# Altium footprint library PowerSupply.PcbLib: 67 footprints (part 1 of 5)
Each footprint in its own frame and in the unit in brackets; x right, y up, seen from the top. Pads: shape width x height; smd on the part's side, far side on the other; paste and mask are expansions set on the pad; w line width, h text height; cw(c..) or ccw(c..) is an arc to the next point about the centre after c.
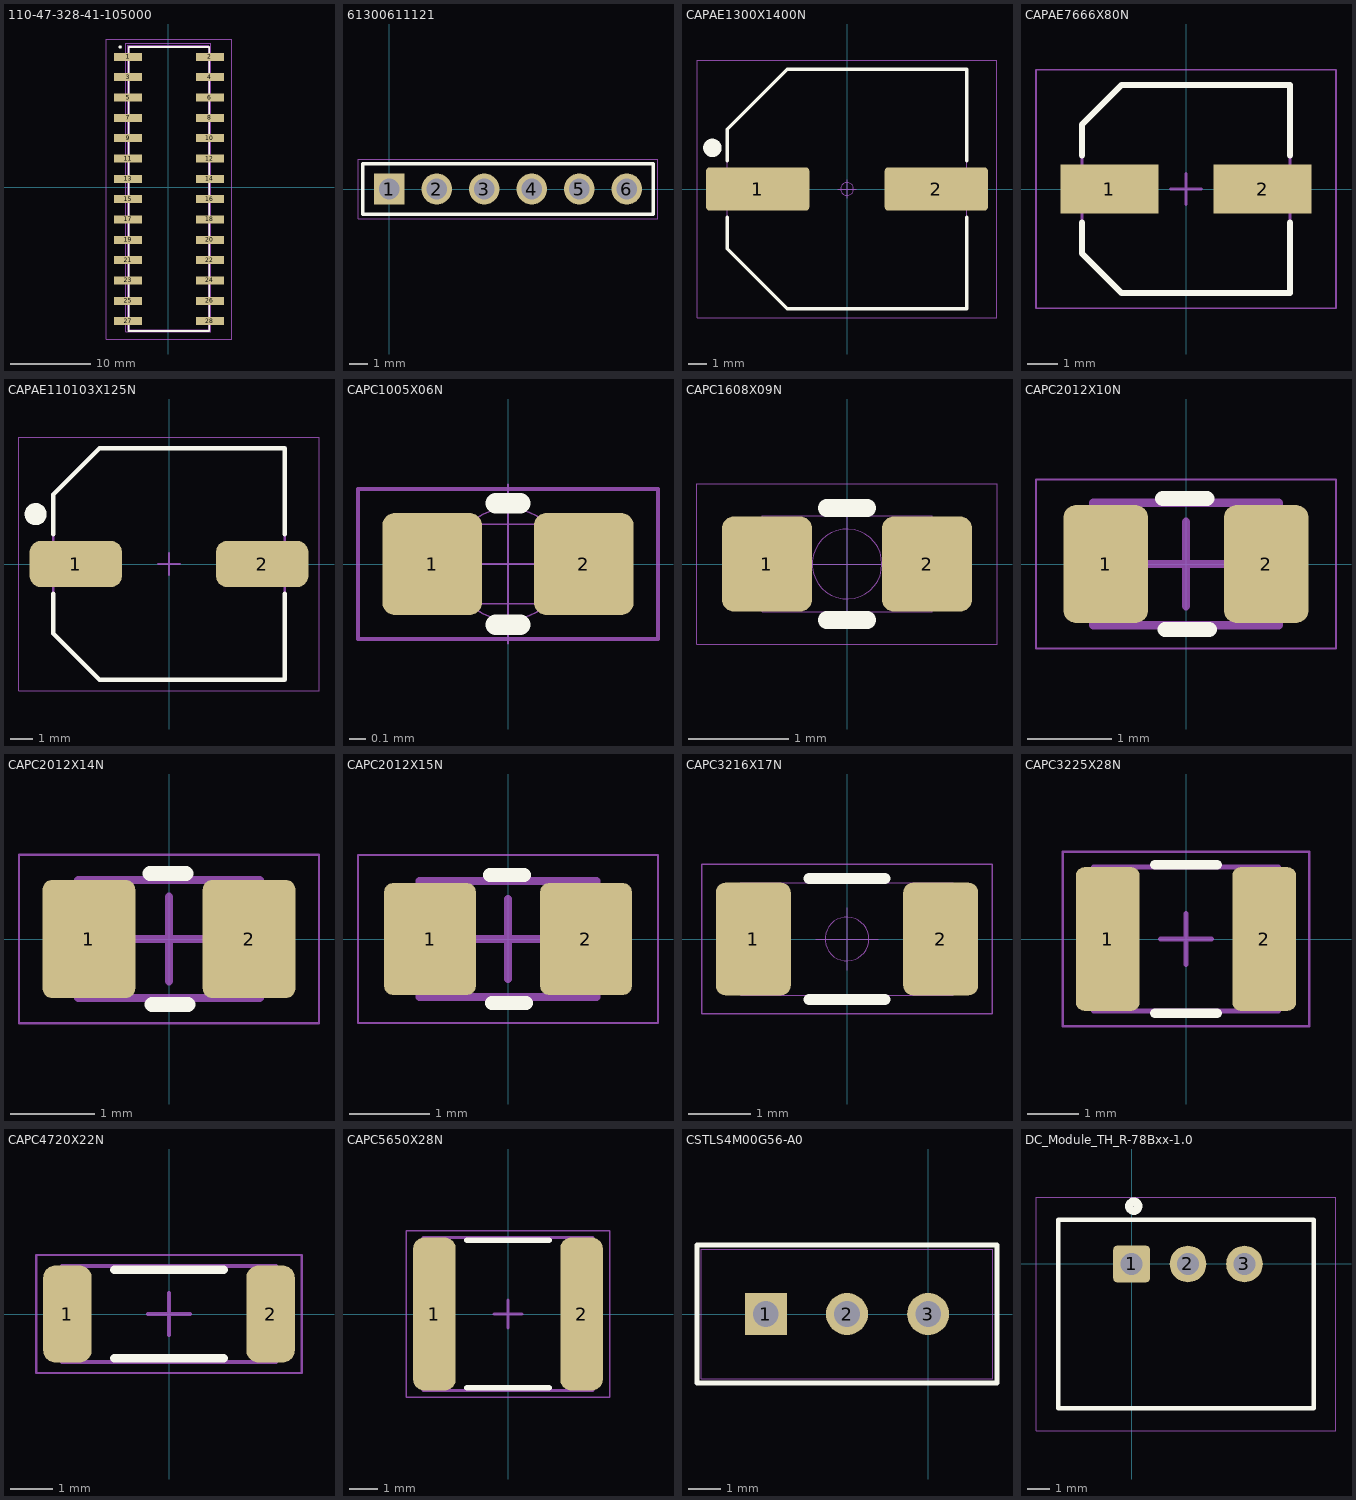
[diagram p0: the footprints below, top view; thin cyan lines are the x and y axes]

## 110-47-328-41-105000 [mm]
pads (28):
  rect 3.51x1 smd: 1(-5.005,16.31) 2(5.205,16.31) 3(-5.005,13.77) 4(5.205,13.77) 5(-5.005,11.23) 6(5.205,11.23) 7(-5.005,8.69) 8(5.205,8.69) 9(-5.005,6.15) 10(5.205,6.15) 11(-5.005,3.61) 12(5.205,3.61) 13(-5.005,1.07) 14(5.205,1.07) 15(-5.005,-1.47) 16(5.205,-1.47) 17(-5.005,-4.01) 18(5.205,-4.01) 19(-5.005,-6.55) 20(5.205,-6.55) 21(-5.005,-9.09) 22(5.205,-9.09) 23(-5.005,-11.63) 24(5.205,-11.63) 25(-5.005,-14.17) 26(5.205,-14.17) 27(-5.005,-16.71) 28(5.205,-16.71)
Top Overlay:
  circle w0.2: c-6,17.55 r0.1
  lines w0.2: -5.005,-17.95 5.15,-17.95 5.15,17.55 -4.95,17.55 -4.95,-17.95
Mech EWOD TEC:
  circle w0.2: c-6,16.5 r0.1
  circle w0.2: c-6,16.5 r0.1
  lines w0.127: -5.08,-17.78 -5.08,17.78 ; -5.08,-17.78 5.08,-17.78 ; -5.08,-17.78 -5.08,17.78 ; -5.08,-17.78 5.08,-17.78 ; -5.08,17.78 5.08,17.78 ; -5.08,17.78 5.08,17.78 ; 5.08,-17.78 5.08,17.78 ; 5.08,-17.78 5.08,17.78
3D Models:
  lines w0.2: -4.95,-17.95 -4.95,17.55 5.15,17.55 5.15,-17.95 -4.95,-17.95
Top Courtyard:
  lines w0.1: -7.76,-18.95 -7.76,18.55 7.96,18.55 7.96,-18.95 -7.76,-18.95
Bottom Courtyard:
  lines w0.05: -5.33,-18.03 -5.33,18.03 5.33,18.03 5.33,-18.03 -5.33,-18.03
3D body "110-xx-328-41-105000.STEP": height 5.59, standoff 0, extent -6.35,-18.05 6.35,17.45
3D body "PIC16F876A-I_SP.stp": height 10.58, standoff 2, extent -4.308,-17.761 3.908,17.1

## 61300611121 [mm]
pads (6):
  rect 1.65x1.65 hole 1.1: 1(0,0)
  round 1.65 hole 1.1: 2(2.54,0) 3(5.08,0) 4(7.62,0) 5(10.16,0) 6(12.7,0)
Top Overlay:
  lines w0.2: -1.42,-1.345 -1.42,1.345 14.12,1.345 14.12,-1.345 -1.42,-1.345
3D Models:
  lines w0.1: -1.42,-1.345 -1.42,1.345 14.12,1.345 14.12,-1.345 -1.42,-1.345
Top Courtyard:
  lines w0.05: -1.67,-1.595 -1.67,1.595 14.37,1.595 14.37,-1.595 -1.67,-1.595
3D body "61300611121.stp": height 8.69, standoff -3.2, extent -1.27,-1.27 13.97,1.27

## CAPAE1300X1400N [mm] "Capacitor,Aluminum Electrolytic;13.00mm L X 13.00mm W X 14.00mm H"
height 14
pads (2):
  rrect15% 5.6x2.35 smd mask+0.064: 1(-4.85,0) 2(4.85,0)
Top Overlay:
  circle w0.5: c-7.315,2.235 r0.25
  lines w0.2: -6.5,-1.55 -6.5,-3.25 -3.25,-6.5 6.5,-6.5 6.5,-1.55 ; -6.5,1.55 -6.5,3.25 -3.25,6.5 6.5,6.5 6.5,1.55
Top Assembly Drawing:
  lines w0.01: -6.5,-3.25 -6.5,3.25 -3.25,6.5 6.5,6.5 6.5,-6.5 -3.25,-6.5 -6.5,-3.25
Top Assembly RefDes:
  text ".Designator" at -1.8,-0.8 h3
Top Courtyard:
  circle w0.01: c0,0 r0.35
  lines w0.01: -0.5,0 0.5,0 ; 0,-0.5 0,0.5 ; -8.15,-7 -8.15,7 8.15,7 8.15,-7 -8.15,-7
3D body "12.5X13.5_Chip.stp": height 13.3, standoff -0.2, extent -7.3,-6.8 7.3,6.8

## CAPAE7666X80N [mm] "Aluminum Electrolytic Capacitor, Body 6.60x6.60x8.00mm, IPC Medium Density"
height 8
pads (2):
  rect 3.2x1.6 smd: 1(-2.5,0) 2(2.5,0)
Top Overlay:
  lines w0.2: -3.4,-1.1 -3.4,-2.1 -2.1,-3.4 3.4,-3.4 3.4,-1.1 ; -3.4,1.1 -3.4,2.1 -2.1,3.4 3.4,3.4 3.4,1.1
Top Assembly Drawing:
  lines w0.1: -3.4,-2.1 -2.1,-3.4 3.4,-3.4 3.4,3.4 -2.1,3.4 -3.4,2.1 -3.4,-2.1
Top Assembly RefDes:
  text ".Designator" at -1.075,-0.45 h1
Top Courtyard:
  lines w0.05: -4.9,-3.9 -4.9,3.9 4.9,3.9 4.9,-3.9 -4.9,-3.9
  lines w0.1: -0.5,0 0.5,0 ; 0,-0.5 0,0.5
3D body "CAPAE7666X80N.step": height 8, standoff 0, extent -3.8,-3.4 3.8,3.4

## CAPAE110103X125N [mm] "Aluminum Electrolytic Capacitor, Body 10.30x10.30x12.50mm, IPC Medium Density"
height 12.5
pads (2):
  rrect50% 4.2x2.1 smd: 1(-4.225,0) 2(4.225,0)
Top Overlay:
  circle w0.5: c-6.045,2.261 r0.25
  lines w0.2: -5.25,-1.35 -5.25,-3.15 -3.15,-5.25 5.25,-5.25 5.25,-1.35 ; -5.25,1.35 -5.25,3.15 -3.15,5.25 5.25,5.25 5.25,1.35
Top Assembly Drawing:
  lines w0.1: -5.25,-3.15 -3.15,-5.25 5.25,-5.25 5.25,5.25 -3.15,5.25 -5.25,3.15 -5.25,-3.15
Top Assembly RefDes:
  text ".Designator" at -1.143,-0.584 h1
Top Courtyard:
  lines w0.05: -6.8,-5.75 -6.8,5.75 6.8,5.75 6.8,-5.75 -6.8,-5.75
  lines w0.1: -0.5,0 0.5,0 ; 0,-0.5 0,0.5
3D body "CAPAE110103X125N.step": height 12.5, standoff 0, extent -5.5,-5.25 5.5,5.25

## CAPC1005X06N [mm] "0402, Body 1.0x0.5x0.60mm, IPC Medium Density"
height 0.6
pads (2):
  rrect25% 0.625x0.64 smd paste+0 mask+0.051: 1(-0.475,0) 2(0.475,0)
Top Overlay:
  lines w0.127: -0.076,-0.381 0.076,-0.381 ; -0.076,0.381 0.076,0.381
Top Assembly Drawing:
  lines w0.01: -0.28,-0.25 -0.28,0.25 ; 0.28,-0.25 0.28,0.25 ; -0.55,-0.25 0.55,-0.25 0.55,0.25 -0.55,0.25 -0.55,-0.25
Top Assembly RefDes:
  text ".Designator" at -0.4,-0.1 h0.5
Top Courtyard:
  circle w0.01: c0,0 r0.35
  lines w0.01: -0.5,0 0.5,0 ; 0,-0.5 0,0.5
  lines w0.025: -0.94,-0.47 0.94,-0.47 0.94,0.47 -0.94,0.47 -0.94,-0.47
3D body "CAPC1005X06N.step": height 0.55, standoff 0, extent -0.525,-0.275 0.525,0.275

## CAPC1608X09N [mm] "0603, Body 1.6x0.8x0.94mm, IPC Medium Density"
height 0.94
pads (2):
  rrect25% 0.9x0.95 smd paste+0 mask+0.064: 1(-0.8,0) 2(0.8,0)
Top Overlay:
  lines w0.178: -0.203,-0.559 0.203,-0.559 ; -0.203,0.559 0.203,0.559
Top Assembly Drawing:
  lines w0.01: -0.85,-0.48 -0.85,0.48 0.85,0.48 0.85,-0.48 -0.85,-0.48
Top Assembly RefDes:
  text ".Designator" at -0.7,-0.2 h1
Top Courtyard:
  circle w0.01: c0,0 r0.35
  lines w0.01: -0.5,0 0.5,0 ; 0,-0.5 0,0.5 ; -1.5,-0.8 1.5,-0.8 1.5,0.8 -1.5,0.8 -1.5,-0.8
3D body "CAPC1608X09N.step": height 0.87, standoff 0, extent -0.875,-0.475 0.875,0.475

## CAPC2012X10N [mm] "0805, Body 2.00x1.25x1.0mm, IPC Medium Density"
height 1
pads (2):
  rrect30% 1x1.4 smd mask+0.064: 1(-0.95,0) 2(0.95,0)
Top Overlay:
  lines w0.178: -0.275,0.775 0.25,0.775 ; -0.25,-0.775 0.275,-0.775
Top Assembly Drawing:
  lines w0.1: -1.1,-0.725 -1.1,0.725 1.1,0.725 1.1,-0.725 -1.1,-0.725
Top Assembly RefDes:
  text "'.Designator'" at -0.5,-0.3 h0.5
Top Courtyard:
  lines w0.025: -1.775,-1 -1.775,1 1.775,1 1.775,-1 -1.775,-1
  lines w0.1: -0.5,0 0.5,0 ; 0,-0.5 0,0.5
3D body "CAPC2012X10N.step": height 0.95, standoff 0, extent -1.1,-0.725 1.1,0.725

## CAPC2012X14N [mm] "0805, Body 2.00x1.25x1.40mm, IPC Medium Density"
height 1.4
pads (2):
  rrect20% 1.1x1.4 smd mask+0.064: 1(-0.95,0) 2(0.95,0)
Top Overlay:
  lines w0.178: -0.225,0.775 0.2,0.775 ; -0.2,-0.775 0.225,-0.775
Top Assembly Drawing:
  lines w0.1: -1.075,-0.7 1.075,-0.7 1.075,0.7 -1.075,0.7 -1.075,-0.7
Top Assembly RefDes:
  text "'.Designator'" at -0.6,-0.3 h0.5
Top Courtyard:
  lines w0.025: -1.78,-1 -1.78,1 1.775,1 ; -1.775,-1 1.775,-1 ; 1.78,-1 1.78,1
  lines w0.1: -0.5,0 0.5,0 ; 0,-0.5 0,0.5
3D body "CAPC2012X14N.step": height 1.4, standoff 0, extent -1.075,-0.7 1.075,0.7

## CAPC2012X15N [mm] "0805, Body 2.01x1.25x1.5mm, IPC Medium Density"
height 1.52
pads (2):
  rrect20% 1.15x1.4 smd mask+0.064: 1(-0.975,0) 2(0.975,0)
Top Overlay:
  lines w0.178: -0.225,0.8 0.2,0.8 ; -0.2,-0.8 0.225,-0.8
Top Assembly Drawing:
  lines w0.1: -1.105,-0.725 1.105,-0.725 1.105,0.725 -1.105,0.725 -1.105,-0.725
Top Assembly RefDes:
  text "'.Designator'" at -0.6,-0.3 h0.5
Top Courtyard:
  lines w0.025: -1.875,-1.05 1.875,-1.05 1.875,1.05 -1.875,1.05 -1.875,-1.05
  lines w0.1: -0.5,0 0.5,0 ; 0,-0.5 0,0.5
3D body "CAPC2012X15N.step": height 1.52, standoff 0, extent -1.105,-0.725 1.105,0.725

## CAPC3216X17N [mm] "1206, Body 3.2x1.6x1.78mm, IPC Medium Density"
height 1.78
pads (2):
  rrect25% 1.2x1.8 smd paste+0 mask+0.064: 1(-1.499,0) 2(1.499,0)
Top Overlay:
  lines w0.178: -0.61,-0.965 0.61,-0.965 ; -0.61,0.965 0.61,0.965
Top Assembly Drawing:
  lines w0.01: -1.2,-0.9 -1.2,0.9 ; 1.2,-0.9 1.2,0.9 ; -1.7,-0.9 1.7,-0.9 1.7,0.9 -1.7,0.9 -1.7,-0.9
Top Assembly RefDes:
  text ".Designator" at -0.8,-0.2 h0.5
Top Courtyard:
  circle w0.01: c0,0 r0.35
  lines w0.01: -0.5,0 0.5,0 ; 0,-0.5 0,0.5
  lines w0.025: -2.325,-1.194 -2.325,1.194 2.325,1.194 2.325,-1.194 -2.325,-1.194
3D body "CAPC3216X17N.step": height 1.7, standoff 0, extent -1.7,-0.9 1.7,0.9

## CAPC3225X28N [mil] "1210, Body 3.20x2.50x2.8mm, IPC Medium Density"
height 110.24
pads (2):
  rrect25% 49x110.2 smd mask+2.5: 1(-60,0) 2(60,0)
Top Overlay:
  lines w7: -24,-57 24,-57 ; -24,57 24,57
Top Assembly RefDes:
  lines w3.94: -70.87,-55.12 70.87,-55.12 70.87,55.12 -70.87,55.12 -70.87,-55.12
  text ".Designator" at -47.24,-15.75 h39.37
Top Courtyard:
  lines w1.97: -94.49,-67 94.49,-67 94.49,67 -94.49,67 -94.49,-67
  lines w3.94: -19.69,0 19.68,0 ; 0,-19.68 0,19.68
3D body "CAPC3225X28N.step": height 110.24, standoff 0, extent -70.87,-55.12 70.87,55.12

## CAPC4720X22N [mm] "Chip Capacitor, 2-Leads, Body 4.73x2.03mm, IPC Medium Density Modified for 3.65mm Clearance between pads"
height 2.16
pads (2):
  rrect50% 1.15x2.3 smd: 1(-2.41,0) 2(2.41,0)
Top Overlay:
  lines w0.2: -1.3,-1.05 1.3,-1.05 ; -1.3,1.05 1.3,1.05
Top Assembly Drawing:
  lines w0.1: -2.54,-1.14 -2.54,1.14 2.54,1.14 2.54,-1.14 -2.54,-1.14
Top Courtyard:
  lines w0.05: -3.15,-1.4 -3.15,1.4 3.15,1.4 3.15,-1.4 -3.15,-1.4
  lines w0.1: -0.5,0 0.5,0 ; 0,-0.5 0,0.5
3D body "CAPC4720X22N.step": height 2.16, standoff 0, extent -2.54,-1.14 2.54,1.14

## CAPC5650X28N [mm] "2220, Body 5.65x5.00x2.80mm, IPC Medium Density"
height 2.8
pads (2):
  rrect50% 1.5x5.4 smd: 1(-2.6,0) 2(2.6,0)
Top Overlay:
  lines w0.2: -1.45,-2.6 1.45,-2.6 ; -1.45,2.6 1.45,2.6
Top Assembly Drawing:
  lines w0.1: -3,-2.7 3,-2.7 3,2.7 -3,2.7 -3,-2.7
Top Assembly RefDes:
  text "'.Designator'" at -1.325,-0.675 h1
Top Courtyard:
  lines w0.05: -3.6,-2.95 3.6,-2.95 3.6,2.95 -3.6,2.95 -3.6,-2.95
  lines w0.1: -0.5,0 0.5,0 ; 0,-0.5 0,0.5
3D body "CAPC5650X28N.step": height 2.8, standoff 0, extent -3,-2.7 3,2.7

## CSTLS4M00G56-A0 [mil]
pads (3):
  rect 51x51 hole 31 mask+0: 1(-196.85,0)
  round 51 hole 31 mask+0: 2(-98.43,0) 3(0,0)
Top Overlay:
  lines w6: -280.43,-83.5 83.57,-83.5 83.57,83.5 -280.43,83.5 -280.43,-83.5
3D Models:
  lines w1: -275.43,-78.5 78.57,-78.5 78.57,78.5 -275.43,78.5 -275.43,-78.5
3D body: height 10, standoff 0, extent 0,0 10,10

## DC_Module_TH_R-78Bxx-1.0 [mm] "Recom, DC/DC Converter, 3-pin 2.54mm pitch"
height 19
pads (3):
  rrect20% 1.65x1.65 hole 1 mask+0.064: 1(0,0)
  round 1.65 hole 1 mask+0.064: 2(2.54,0) 3(5.08,0)
Top Overlay:
  circle w0.381: c0.1,2.6 r0.2
  lines w0.203: -3.3,-6.5 8.2,-6.5 8.2,2 -3.3,2 -3.3,-6.5
Top Assembly Drawing:
  lines w0.013: -3.3,-6.5 8.2,-6.5 8.2,2 -3.3,2 -3.3,-6.5
Top Assembly RefDes:
  text ".Designator" at -0.9,-3.3 h1
Top Courtyard:
  circle w0.001: c0,0 r0.35
  lines w0.001: -0.5,0 0.5,0 ; 0,-0.5 0,0.5 ; -4.3,-7.5 9.2,-7.5 9.2,3 -4.3,3 -4.3,-7.5
3D body: height 19, standoff 0, extent -3.3,-6.5 8.2,2